# Altium footprint library LHAC-4XDSP2XV7-VP5_0226_3.PcbLib: 96 footprints (part 2 of 12)
Each footprint in its own frame and in the unit in brackets; x right, y up, seen from the top. Pads: shape width x height; smd on the part's side, far side on the other; paste and mask are expansions set on the pad; w line width, h text height; cw(c..) or ccw(c..) is an arc to the next point about the centre after c.
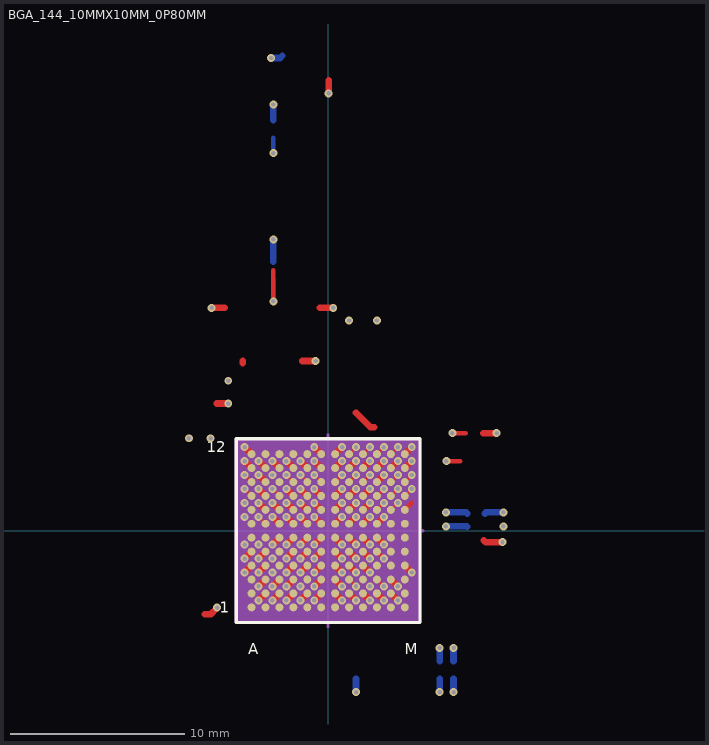
[diagram p1: the footprint, top view; thin cyan lines are the x and y axes]

## BGA_144_10MMX10MM_0P80MM [mil] "BGA_144_10MMX10MM_0P80MM"
pads (144):
  round 18 smd: A1(-173.23,-173.23) A2(-173.23,-141.73) A3(-173.23,-110.24) A4(-173.23,-78.74) A5(-173.23,-47.24) A6(-173.23,-15.75) A7(-173.23,15.75) A8(-173.23,47.24) A9(-173.23,78.74) A10(-173.23,110.24) A11(-173.23,141.73) A12(-173.23,173.23) B1(-141.73,-173.23) B2(-141.73,-141.73) B3(-141.73,-110.24) B4(-141.73,-78.74) B5(-141.73,-47.24) B6(-141.73,-15.75) B7(-141.73,15.75) B8(-141.73,47.24) B9(-141.73,78.74) B10(-141.73,110.24) B11(-141.73,141.73) B12(-141.73,173.23) C1(-110.24,-173.23) C2(-110.24,-141.73) C3(-110.24,-110.24) C4(-110.24,-78.74) C5(-110.24,-47.24) C6(-110.24,-15.75) C7(-110.24,15.75) C8(-110.24,47.24) C9(-110.24,78.74) C10(-110.24,110.24) C11(-110.24,141.73) C12(-110.24,173.23) D1(-78.74,-173.23) D2(-78.74,-141.73) D3(-78.74,-110.24) D4(-78.74,-78.74) D5(-78.74,-47.24) D6(-78.74,-15.75) D7(-78.74,15.75) D8(-78.74,47.24) D9(-78.74,78.74) D10(-78.74,110.24) D11(-78.74,141.73) D12(-78.74,173.23) E1(-47.24,-173.23) E2(-47.24,-141.73) E3(-47.24,-110.24) E4(-47.24,-78.74) E5(-47.24,-47.24) E6(-47.24,-15.75) E7(-47.24,15.75) E8(-47.24,47.24) E9(-47.24,78.74) E10(-47.24,110.24) E11(-47.24,141.73) E12(-47.24,173.23) F1(-15.75,-173.23) F2(-15.75,-141.73) F3(-15.75,-110.24) F4(-15.75,-78.74) F5(-15.75,-47.24) F6(-15.75,-15.75) F7(-15.75,15.75) F8(-15.75,47.24) F9(-15.75,78.74) F10(-15.75,110.24) F11(-15.75,141.73) F12(-15.75,173.23) G1(15.75,-173.23) G2(15.75,-141.73) G3(15.75,-110.24) G4(15.75,-78.74) G5(15.75,-47.24) G6(15.75,-15.75) G7(15.75,15.75) G8(15.75,47.24) G9(15.75,78.74) G10(15.75,110.24) G11(15.75,141.73) G12(15.75,173.23) H1(47.24,-173.23) H2(47.24,-141.73) H3(47.24,-110.24) H4(47.24,-78.74) H5(47.24,-47.24) H6(47.24,-15.75) H7(47.24,15.75) H8(47.24,47.24) H9(47.24,78.74) H10(47.24,110.24) H11(47.24,141.73) H12(47.24,173.23) J1(78.74,-173.23) J2(78.74,-141.73) J3(78.74,-110.24) J4(78.74,-78.74) J5(78.74,-47.24) J6(78.74,-15.75) J7(78.74,15.75) J8(78.74,47.24) J9(78.74,78.74) J10(78.74,110.24) J11(78.74,141.73) J12(78.74,173.23) K1(110.24,-173.23) K2(110.24,-141.73) K3(110.24,-110.24) K4(110.24,-78.74) K5(110.24,-47.24) K6(110.24,-15.75) K7(110.24,15.75) K8(110.24,47.24) K9(110.24,78.74) K10(110.24,110.24) K11(110.24,141.73) K12(110.24,173.23) L1(141.73,-173.23) L2(141.73,-141.73) L3(141.73,-110.24) L4(141.73,-78.74) L5(141.73,-47.24) L6(141.73,-15.75) L7(141.73,15.75) L8(141.73,47.24) L9(141.73,78.74) L10(141.73,110.24) L11(141.73,141.73) L12(141.73,173.23) M1(173.23,-173.23) M2(173.23,-141.73) M3(173.23,-110.24) M4(173.23,-78.74) M5(173.23,-47.24) M6(173.23,-15.75) M7(173.23,15.75) M8(173.23,47.24) M9(173.23,78.74) M10(173.23,110.24) M11(173.23,141.73) M12(173.23,173.23)
via 252,-265 diameter 18 hole 10
via 283.5,-265 diameter 18 hole 10
via 396.03,41.47 diameter 18 hole 10
via 396.03,9.97 diameter 18 hole 10
via 188.98,-94.49 diameter 18 hole 10
via -62.98,-31.49 diameter 18 hole 10
via -125.98,62.98 diameter 18 hole 10
via 62.98,62.98 diameter 18 hole 10
via -157.47,-62.98 diameter 18 hole 10
via -31.49,-31.49 diameter 18 hole 10
via 31.49,-31.49 diameter 18 hole 10
via 157.47,-125.98 diameter 18 hole 10
via 94.48,-125.98 diameter 18 hole 10
via -94.48,62.98 diameter 18 hole 10
via -62.98,62.98 diameter 18 hole 10
via -31.49,62.98 diameter 18 hole 10
via 31.49,62.98 diameter 18 hole 10
via 94.48,62.98 diameter 18 hole 10
via -62.98,31.49 diameter 18 hole 10
via -31.49,31.49 diameter 18 hole 10
via 31.49,31.49 diameter 18 hole 10
via 62.98,31.49 diameter 18 hole 10
via 62.98,-31.49 diameter 18 hole 10
via -62.98,-62.98 diameter 18 hole 10
via -31.49,-62.98 diameter 18 hole 10
via 31.49,-62.98 diameter 18 hole 10
via 62.98,-62.98 diameter 18 hole 10
via -157.47,-94.48 diameter 18 hole 10
via -157.47,-125.98 diameter 18 hole 10
via -125.98,-125.98 diameter 18 hole 10
via -157.47,-157.47 diameter 18 hole 10
via -125.98,-157.47 diameter 18 hole 10
via -94.48,-157.47 diameter 18 hole 10
via -62.98,-157.47 diameter 18 hole 10
via 62.98,-157.47 diameter 18 hole 10
via 94.48,-157.47 diameter 18 hole 10
via 125.98,-157.47 diameter 18 hole 10
via 157.47,-157.47 diameter 18 hole 10
via 63.03,-365.03 diameter 18 hole 10
via -250.92,-174.03 diameter 18 hole 10
via -188.97,-62.98 diameter 18 hole 10
via -188.98,-94.49 diameter 18 hole 10
via 380.81,220.5 diameter 18 hole 10
via 188.98,188.98 diameter 18 hole 10
via 188.97,157.47 diameter 18 hole 10
via -28.49,383.72 diameter 18 hole 10
via 94.48,157.47 diameter 18 hole 10
via -31.49,188.97 diameter 18 hole 10
via 31.49,188.97 diameter 18 hole 10
via -94.48,157.47 diameter 18 hole 10
via -62.98,157.47 diameter 18 hole 10
via -31.49,157.47 diameter 18 hole 10
via 31.49,157.47 diameter 18 hole 10
via 62.98,157.47 diameter 18 hole 10
via 125.98,157.47 diameter 18 hole 10
via 157.47,157.47 diameter 18 hole 10
via 110.28,475.22 diameter 18 hole 10
via -123.97,658.72 diameter 18 hole 10
via 11.51,503.72 diameter 18 hole 10
via -123.97,963.72 diameter 18 hole 10
via -225.92,287.5 diameter 18 hole 10
via -188.98,188.98 diameter 18 hole 10
via -188.97,157.47 diameter 18 hole 10
via -157.47,157.47 diameter 18 hole 10
via -125.98,157.47 diameter 18 hole 10
via -225.92,339.06 diameter 18 hole 10
via -263.49,503.72 diameter 18 hole 10
via -128.97,1068.72 diameter 18 hole 10
via 1.03,988.72 diameter 18 hole 10
via 47.28,475.22 diameter 18 hole 10
via 157.47,94.48 diameter 18 hole 10
via 188.97,125.98 diameter 18 hole 10
via 188.98,94.49 diameter 18 hole 10
via 157.47,125.98 diameter 18 hole 10
via -157.47,31.49 diameter 18 hole 10
via -157.47,-31.49 diameter 18 hole 10
via -188.97,125.98 diameter 18 hole 10
via -188.98,94.49 diameter 18 hole 10
via -188.97,31.49 diameter 18 hole 10
via -188.97,-31.49 diameter 18 hole 10
via 283.5,-365 diameter 18 hole 10
via 252,-365 diameter 18 hole 10
via 394.08,-25.94 diameter 18 hole 10
via 280.81,220.5 diameter 18 hole 10
via 267.31,157.5 diameter 18 hole 10
via 94.48,125.98 diameter 18 hole 10
via -94.48,125.98 diameter 18 hole 10
via -62.98,125.98 diameter 18 hole 10
via 62.98,125.98 diameter 18 hole 10
via -125.98,-94.48 diameter 18 hole 10
via -188.97,62.98 diameter 18 hole 10
via -157.47,62.98 diameter 18 hole 10
via -123.97,518.72 diameter 18 hole 10
via -157.47,94.48 diameter 18 hole 10
via -157.47,125.98 diameter 18 hole 10
via -265.92,209.06 diameter 18 hole 10
via -315,209.06 diameter 18 hole 10
via 266.03,41.47 diameter 18 hole 10
via 266.03,9.97 diameter 18 hole 10
via 125.98,-31.49 diameter 18 hole 10
via 125.98,31.49 diameter 18 hole 10
via 157.47,62.98 diameter 18 hole 10
via 62.98,-125.98 diameter 18 hole 10
via 125.98,94.48 diameter 18 hole 10
via -125.98,-31.49 diameter 18 hole 10
via -125.98,31.49 diameter 18 hole 10
via -94.48,31.49 diameter 18 hole 10
via -94.48,-31.49 diameter 18 hole 10
via 125.98,62.98 diameter 18 hole 10
via 125.98,-62.98 diameter 18 hole 10
via -125.98,94.48 diameter 18 hole 10
via 125.98,-125.98 diameter 18 hole 10
via 31.49,125.98 diameter 18 hole 10
via -62.98,-125.98 diameter 18 hole 10
via -94.49,94.49 diameter 18 hole 10
via -62.98,94.48 diameter 18 hole 10
via -31.49,94.48 diameter 18 hole 10
via 94.49,94.49 diameter 18 hole 10
via 62.98,94.48 diameter 18 hole 10
via 31.49,94.48 diameter 18 hole 10
via -31.49,125.98 diameter 18 hole 10
via -31.49,-157.47 diameter 18 hole 10
via 31.49,-157.47 diameter 18 hole 10
via -125.98,-62.98 diameter 18 hole 10
via -125.98,125.98 diameter 18 hole 10
via 125.98,125.98 diameter 18 hole 10
via -31.49,-125.98 diameter 18 hole 10
via 31.49,-125.98 diameter 18 hole 10
via -123.97,853.72 diameter 18 hole 10
via 94.48,31.49 diameter 18 hole 10
via -31.49,-94.48 diameter 18 hole 10
via 31.49,-94.48 diameter 18 hole 10
via 94.48,-62.98 diameter 18 hole 10
via 94.48,-31.49 diameter 18 hole 10
via -94.48,-125.98 diameter 18 hole 10
via -94.49,-94.49 diameter 18 hole 10
via -62.98,-94.48 diameter 18 hole 10
via 62.98,-94.48 diameter 18 hole 10
via 94.49,-94.49 diameter 18 hole 10
via -94.48,-62.98 diameter 18 hole 10
via 62.98,188.97 diameter 18 hole 10
via 94.49,188.98 diameter 18 hole 10
via 125.98,188.97 diameter 18 hole 10
via 157.47,188.97 diameter 18 hole 10
Top Layer:
  lines w5: -188.98,94.49 -173.23,78.74 ; -188.97,125.98 -173.23,110.24 ; -157.47,31.49 -141.73,15.75 ; -125.98,94.48 -110.24,78.74 ; -94.48,125.98 -78.74,110.24 ; -62.98,125.98 -47.24,110.24 ; -31.49,125.98 -15.75,110.24 ; 15.75,110.24 31.49,125.98 ; 47.24,-110.24 62.98,-125.98 ; 47.24,110.24 62.98,125.98 ; 47.24,173.23 62.98,188.97 ; 78.74,110.24 94.48,125.98 ; 78.74,173.23 94.49,188.98 ; 110.24,-110.24 125.98,-125.98 ; 110.24,47.24 125.98,62.98 ; 110.24,78.74 125.98,94.48 ; 110.24,173.23 125.98,188.97 ; 141.73,47.24 157.47,62.98 ; 141.73,78.74 157.47,94.48 ; 141.73,110.24 157.47,125.98 ; 141.73,173.23 157.47,188.97 ; 173.23,78.74 188.98,94.49 ; 173.23,110.24 188.97,125.98
  lines w10: -123.97,518.72 -123.97,588.72 ; 110.24,-47.24 125.98,-62.98 ; 173.23,47.24 188.97,62.98 ; 267.31,157.5 298.31,157.5 ; 280.81,220.5 310.81,220.5
  lines w15: -279.22,-189.03 -265.92,-189.03 -250.92,-174.03 ; -263.49,503.72 -233.49,503.72 ; -252,287.5 -225.92,287.5 ; -193.49,379.07 -193.49,383.72 ; -188.98,-94.49 -173.23,-78.74 ; -188.98,188.98 -173.23,173.23 ; -188.97,-62.98 -173.23,-47.24 ; -188.97,157.47 -173.23,141.73 ; -157.47,-157.47 -141.73,-141.73 ; -157.47,-125.98 -141.73,-110.24 ; -157.47,-94.48 -141.73,-78.74 ; -157.47,-62.98 -141.73,-47.24 ; -157.47,62.98 -141.73,47.24 ; -157.47,94.48 -141.73,78.74 ; -157.47,125.98 -141.73,110.24 ; -157.47,157.47 -141.73,141.73 ; -125.98,-157.47 -110.24,-141.73 ; -125.98,-125.98 -110.24,-110.24 ; -125.98,-31.49 -110.24,-15.75 ; -125.98,31.49 -110.24,15.75 ; -125.98,62.98 -110.24,47.24 ; -125.98,157.47 -110.24,141.73 ; -94.48,-157.47 -78.74,-141.73 ; -94.48,-125.98 -78.74,-110.24 ; -94.49,-94.49 -78.74,-78.74 ; -94.48,-62.98 -78.74,-47.24 ; -94.48,-31.49 -78.74,-15.75 ; -94.48,31.49 -78.74,15.75 ; -94.48,62.98 -78.74,47.24 ; -94.49,94.49 -78.74,78.74 ; -94.48,157.47 -78.74,141.73 ; -62.98,-157.47 -47.24,-141.73 ; -62.98,-94.48 -47.24,-78.74 ; -62.98,-62.98 -47.24,-47.24 ; -62.98,-31.49 -47.24,-15.75 ; -62.98,31.49 -47.24,15.75 ; -62.98,62.98 -47.24,47.24 ; -62.98,94.48 -47.24,78.74 ; -62.98,157.47 -47.24,141.73 ; -58.49,383.72 -28.49,383.72 ; -31.49,-157.47 -15.75,-141.73 ; -31.49,-125.98 -15.75,-110.24 ; -31.49,-94.48 -15.75,-78.74 ; -31.49,-62.98 -15.75,-47.24 ; -31.49,-31.49 -15.75,-15.75 ; -31.49,31.49 -15.75,15.75 ; -31.49,62.98 -15.75,47.24 ; -31.49,94.48 -15.75,78.74 ; -31.49,157.47 -15.75,141.73 ; -31.49,188.97 -15.75,173.23 ; -18.49,503.72 11.51,503.72 ; 1.03,988.72 1.03,1018.72 ; 15.75,-141.73 31.49,-157.47 ; 15.75,-110.24 31.49,-125.98 ; 15.75,-78.74 31.49,-94.48 ; 15.75,-47.24 31.49,-62.98 ; 15.75,-15.75 31.49,-31.49 ; 15.75,15.75 31.49,31.49 ; 15.75,47.24 31.49,62.98 ; 15.75,78.74 31.49,94.48 ; 15.75,141.73 31.49,157.47 ; 15.75,173.23 31.49,188.97 ; 47.24,-141.73 62.98,-157.47 ; 47.24,-78.74 62.98,-94.48 ; 47.24,-47.24 62.98,-62.98 ; 47.24,-15.75 62.98,-31.49 ; 47.24,15.75 62.98,31.49 ; 47.24,47.24 62.98,62.98 ; 47.24,78.74 62.98,94.48 ; 47.24,141.73 62.98,157.47 ; 63,266.75 95.69,234.06 104.08,234.06 ; 78.74,-141.73 94.48,-157.47 ; 78.74,-78.74 94.49,-94.49 ; 78.74,-47.24 94.48,-62.98 ; 78.74,-15.75 94.48,-31.49 ; 78.74,15.75 94.48,31.49 ; 78.74,47.24 94.48,62.98 ; 78.74,78.74 94.49,94.49 ; 78.74,141.73 94.48,157.47 ; 110.24,-141.73 125.98,-157.47 ; 110.24,-15.75 125.98,-31.49 ; 110.24,15.75 125.98,31.49 ; 110.24,110.24 125.98,125.98 ; 110.24,141.73 125.98,157.47 ; 141.73,-141.73 157.47,-157.47 ; 141.73,-110.24 157.47,-125.98 ; 141.73,141.73 157.47,157.47 ; 173.23,-78.74 188.98,-94.49 ; 173.23,141.73 188.97,157.47 ; 173.23,173.23 188.98,188.98 ; 350.81,220.5 380.81,220.5 ; 351.53,-21.53 355.94,-25.94 394.08,-25.94
Bottom Layer:
  lines w10: -123.97,518.72 -123.97,568.72 ; -123.97,853.72 -123.97,888.72
  lines w15: -128.97,1068.72 -108.97,1068.72 -103.97,1073.72 ; -123.97,608.72 -123.97,658.72 ; -123.97,928.72 -123.97,963.72 ; 63.03,-365.03 63.03,-335.03 ; 252,-365 252,-335 ; 252,-295 252,-265 ; 266.03,9.97 313.67,9.97 314.58,9.06 ; 266.03,41.47 312.17,41.47 314.58,39.06 ; 283.5,-365 283.5,-335 ; 283.5,-295 283.5,-265 ; 354.58,39.06 356.99,41.47 396.03,41.47
Top Overlay:
  lines w7: -207.87,-207.87 -207.87,207.87 207.87,207.87 207.87,-207.87 -207.87,-207.87
  text ".Designator" at 221.58,54.05 h25
  text "12" at -274.02,177.48 h25
  text "1" at -245.67,-185.28 h25
  text "A" at -180.31,-279.76 h25
  text "M" at 173.23,-279.76 h25
Mechanical 5:
  lines w7: -207.87,-207.87 -207.87,207.87 207.87,207.87 207.87,-207.87 -207.87,-207.87
  text "M" at 173.23,-279.76 h25
  text "A" at -215.31,-244.76 h25
  text "1" at -254.01,-176.94 h25
  text "12" at -274.03,177.48 h25
  text "U131" at 221.58,54.05 h25
Mechanical 14:
  text "M4" at 173.23,-58.74 h25
  text "E6" at -47.24,24.25 h25
  text "C8" at -110.24,87.24 h25
  text "H8" at 47.24,67.24 h25
  text "B5" at -141.73,-7.24 h25
  text "F6" at -15.75,4.25 h25
  text "G6" at 15.75,4.25 h25
  text "L3" at 141.73,-90.24 h25
  text "J3" at 78.74,-90.24 h25
  text "D8" at -78.74,87.24 h25
  text "E8" at -47.24,87.24 h25
  text "F8" at -15.75,67.24 h25
  text "G8" at 15.75,67.24 h25
  text "J8" at 78.74,67.24 h25
  text "E7" at -47.24,55.75 h25
  text "F7" at -15.75,35.75 h25
  text "G7" at 15.75,35.75 h25
  text "H7" at 47.24,35.75 h25
  text "H6" at 47.24,4.25 h25
  text "E5" at -47.24,-7.24 h25
  text "F5" at -15.75,-27.24 h25
  text "G5" at 15.75,-27.24 h25
  text "H5" at 47.24,-27.24 h25
  text "B4" at -141.73,-38.74 h25
  text "B3" at -141.73,-70.24 h25
  text "C3" at -110.24,-70.24 h25
  text "B2" at -141.73,-101.73 h25
  text "C2" at -110.24,-101.73 h25
  text "D2" at -78.74,-101.73 h25
  text "E2" at -47.24,-101.73 h25
  text "H2" at 47.24,-121.73 h25
  text "J2" at 78.74,-121.73 h25
  text "K2" at 110.24,-121.73 h25
  text "L2" at 141.73,-121.73 h25
  text "A5" at -173.23,-7.24 h25
  text "A4" at -173.23,-38.74 h25
  text "M12" at 173.23,203.23 h25
  text "M11" at 173.23,171.73 h25
  text "J11" at 78.74,171.73 h25
  text "F12" at -15.75,203.23 h25
  text "G12" at 15.75,203.23 h25
  text "D11" at -78.74,201.73 h25
  text "E11" at -47.24,201.73 h25
  text "F11" at -15.75,171.73 h25
  text "G11" at 15.75,171.73 h25
  text "H11" at 47.24,171.73 h25
  text "K11" at 110.24,171.73 h25
  text "L11" at 141.73,171.73 h25
  text "A12" at -173.23,233.23 h25
  text "A11" at -173.23,201.73 h25
  text "B11" at -141.73,201.73 h25
  text "C11" at -110.24,201.73 h25
  text "L9" at 141.73,98.74 h25
  text "M10" at 173.23,140.24 h25
  text "M9" at 173.23,98.74 h25
  text "L10" at 141.73,140.24 h25
  text "B7" at -141.73,55.75 h25
  text "B6" at -141.73,24.25 h25
  text "A10" at -173.23,170.24 h25
  text "A9" at -173.23,118.74 h25
  text "A7" at -173.23,55.75 h25
  text "A6" at -173.23,24.25 h25
  text "J10" at 78.74,140.24 h25
  text "D10" at -78.74,170.24 h25
  text "E10" at -47.24,170.24 h25
  text "H10" at 47.24,140.24 h25
  text "K1" at 110.24,-153.23 h25
  text "C4" at -110.24,-38.74 h25
  text "A8" at -173.23,87.24 h25
  text "B8" at -141.73,87.24 h25
  text "B9" at -141.73,118.74 h25
  text "B10" at -141.73,170.24 h25
  text "K6" at 110.24,4.25 h25
  text "K7" at 110.24,35.75 h25
  text "L8" at 141.73,67.24 h25
  text "H3" at 47.24,-90.24 h25
  text "G1" at 15.75,-153.23 h25
  text "K9" at 110.24,98.74 h25
  text "C6" at -110.24,24.25 h25
  text "C7" at -110.24,55.75 h25
  text "D7" at -78.74,55.75 h25
  text "D6" at -78.74,24.25 h25
  text "K8" at 110.24,67.24 h25
  text "K5" at 110.24,-27.24 h25
  text "C9" at -110.24,118.74 h25
  text "K3" at 110.24,-90.24 h25
  text "G10" at 15.75,140.24 h25
  text "E3" at -47.24,-70.24 h25
  text "J1" at 78.74,-153.23 h25
  text "D9" at -78.74,118.74 h25
  text "E9" at -47.24,118.74 h25
  text "F9" at -15.75,98.74 h25
  text "J9" at 78.74,98.74 h25
  text "H9" at 47.24,98.74 h25
  text "G9" at 15.75,98.74 h25
  text "F10" at -15.75,140.24 h25
  text "F2" at -15.75,-121.73 h25
  text "G2" at 15.75,-121.73 h25
  text "C5" at -110.24,-7.24 h25
  text "C10" at -110.24,170.24 h25
  text "K10" at 110.24,140.24 h25
  text "H1" at 47.24,-153.23 h25
  text "F3" at -15.75,-90.24 h25
  text "G3" at 15.75,-90.24 h25
  text "J7" at 78.74,35.75 h25
  text "F4" at -15.75,-58.74 h25
  text "G4" at 15.75,-58.74 h25
  text "J5" at 78.74,-27.24 h25
  text "J6" at 78.74,4.25 h25
  text "D3" at -78.74,-70.24 h25
  text "D4" at -78.74,-38.74 h25
  text "E4" at -47.24,-38.74 h25
  text "H4" at 47.24,-58.74 h25
  text "J4" at 78.74,-58.74 h25
  text "D5" at -78.74,-7.24 h25
  text "M3" at 173.23,-90.24 h25
  text "M2" at 173.23,-121.73 h25
  text "L1" at 141.73,-153.23 h25
  text "M1" at 173.23,-153.23 h25
  text "E12" at -47.24,233.23 h25
  text "D12" at -78.74,233.23 h25
  text "H12" at 47.24,203.23 h25
  text "J12" at 78.74,203.23 h25
  text "K12" at 110.24,203.23 h25
  text "L12" at 141.73,203.23 h25
  text "B12" at -141.73,233.23 h25
  text "C12" at -110.24,233.23 h25
  text "M8" at 173.23,67.24 h25
  text "L4" at 141.73,-58.74 h25
  text "M5" at 173.23,-27.24 h25
  text "L5" at 141.73,-27.24 h25
  text "K4" at 110.24,-58.74 h25
  text "L7" at 141.73,35.75 h25
  text "L6" at 141.73,4.25 h25
  text "M7" at 173.23,35.75 h25
  text "M6" at 173.23,4.25 h25
  text "A3" at -173.23,-70.24 h25
  text "A2" at -173.23,-101.73 h25
  text "B1" at -141.73,-133.23 h25
  text "A1" at -173.23,-153.23 h25
  text "C1" at -110.24,-133.23 h25
  text "D1" at -78.74,-133.23 h25
  text "F1" at -15.75,-153.23 h25
  text "E1" at -47.24,-133.23 h25
Mechanical 16:
  region: -206.85,-206.85 206.85,-206.85 206.85,206.85 -206.85,206.85
  lines w1: -196.85,-196.85 -196.85,196.85 196.85,196.85 196.85,-196.85 -196.85,-196.85
  lines w7: -204.72,0 214.17,0 ; 0,-217.32 0,217.32
Mechanical 17:
  text "A" at -185.83,-251.42 h25
  text "M" at 179.53,-248.27 h25
  text "1" at -229.92,-178.98 h25
  text "12" at -248.82,186.93 h25
3D body: height 150, standoff 0, extent -206.85,-206.85 206.85,206.85